# Altium footprint library IC_SMD_BGA.PCBLIB: 97 footprints (part 2 of 11)
Each footprint in its own frame and in the unit in brackets; x right, y up, seen from the top. Pads: shape width x height; smd on the part's side, far side on the other; paste and mask are expansions set on the pad; w line width, h text height; cw(c..) or ccw(c..) is an arc to the next point about the centre after c.
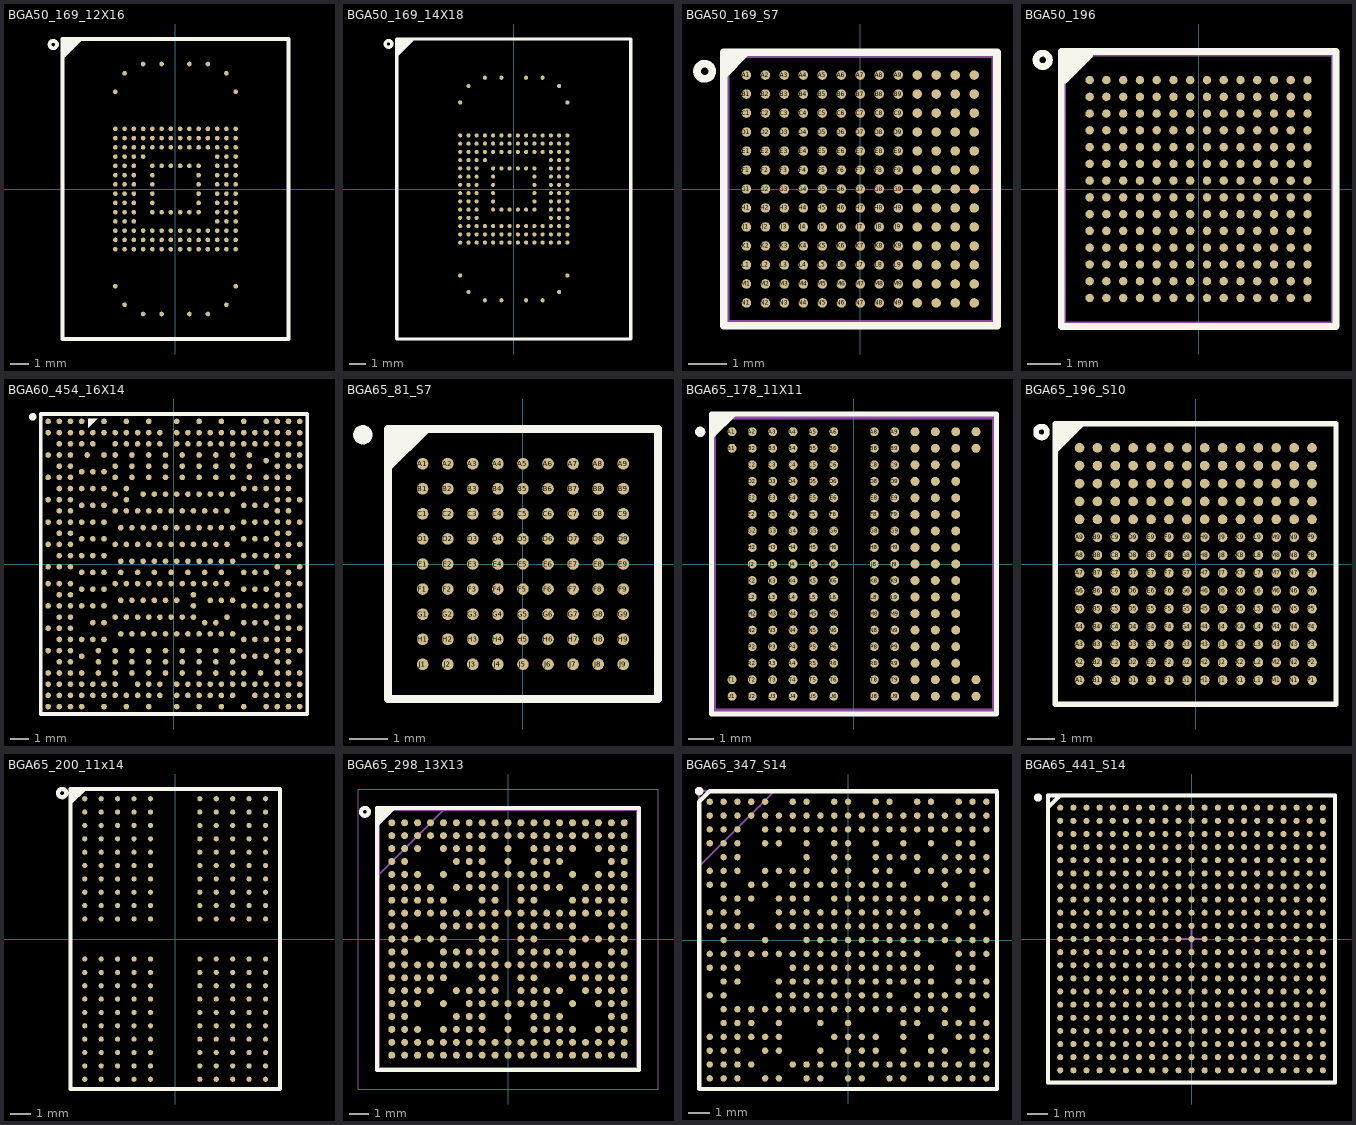
[diagram p1: the footprints below, top view; thin cyan lines are the x and y axes]

## BGA50_169_12X16 [mm] "BGA 153ball, pitch:0.5mm, 12x16mm"
pads (169):
  round 0.25 smd mask+0.05: A4(-1.75,6.75) A6(-0.75,6.75) A9(0.75,6.75) A11(1.75,6.75) AA1(-3.25,-3.25) AA2(-2.75,-3.25) AA3(-2.25,-3.25) AA4(-1.75,-3.25) AA5(-1.25,-3.25) AA6(-0.75,-3.25) AA7(-0.25,-3.25) AA8(0.25,-3.25) AA9(0.75,-3.25) AA10(1.25,-3.25) AA11(1.75,-3.25) AA12(2.25,-3.25) AA13(2.75,-3.25) AA14(3.25,-3.25) AE1(-3.25,-5.25) AE14(3.25,-5.25) AG2(-2.75,-6.25) AG13(2.75,-6.25) AH4(-1.75,-6.75) AH6(-0.75,-6.75) AH9(0.75,-6.75) AH11(1.75,-6.75) B2(-2.75,6.25) B13(2.75,6.25) D1(-3.25,5.25) D14(3.25,5.25) H1(-3.25,3.25) H2(-2.75,3.25) H3(-2.25,3.25) H4(-1.75,3.25) H5(-1.25,3.25) H6(-0.75,3.25) H7(-0.25,3.25) H8(0.25,3.25) H9(0.75,3.25) H10(1.25,3.25) H11(1.75,3.25) H12(2.25,3.25) H13(2.75,3.25) H14(3.25,3.25) J1(-3.25,2.75) J2(-2.75,2.75) J3(-2.25,2.75) J4(-1.75,2.75) J5(-1.25,2.75) J6(-0.75,2.75) J7(-0.25,2.75) J8(0.25,2.75) J9(0.75,2.75) J10(1.25,2.75) J11(1.75,2.75) J12(2.25,2.75) J13(2.75,2.75) J14(3.25,2.75) K1(-3.25,2.25) K2(-2.75,2.25) K3(-2.25,2.25) K4(-1.75,2.25) K5(-1.25,2.25) K6(-0.75,2.25) K7(-0.25,2.25) K8(0.25,2.25) K9(0.75,2.25) K10(1.25,2.25) K11(1.75,2.25) K12(2.25,2.25) K13(2.75,2.25) K14(3.25,2.25) L1(-3.25,1.75) L2(-2.75,1.75) L3(-2.25,1.75) L4(-1.75,1.75) L12(2.25,1.75) L13(2.75,1.75) L14(3.25,1.75) M1(-3.25,1.25) M2(-2.75,1.25) M3(-2.25,1.25) M5(-1.25,1.25) M6(-0.75,1.25) M7(-0.25,1.25) M8(0.25,1.25) M9(0.75,1.25) M10(1.25,1.25) M12(2.25,1.25) M13(2.75,1.25) M14(3.25,1.25) N1(-3.25,0.75) N2(-2.75,0.75) N3(-2.25,0.75) N5(-1.25,0.75) N10(1.25,0.75) N12(2.25,0.75) N13(2.75,0.75) N14(3.25,0.75) P1(-3.25,0.25) P2(-2.75,0.25) P3(-2.25,0.25) P5(-1.25,0.25) P10(1.25,0.25) P12(2.25,0.25) P13(2.75,0.25) P14(3.25,0.25) R1(-3.25,-0.25) R2(-2.75,-0.25) R3(-2.25,-0.25) R5(-1.25,-0.25) R10(1.25,-0.25) R12(2.25,-0.25) R13(2.75,-0.25) R14(3.25,-0.25) T1(-3.25,-0.75) T2(-2.75,-0.75) T3(-2.25,-0.75) T5(-1.25,-0.75) T10(1.25,-0.75) T12(2.25,-0.75) T13(2.75,-0.75) T14(3.25,-0.75) U1(-3.25,-1.25) U2(-2.75,-1.25) U3(-2.25,-1.25) U5(-1.25,-1.25) U6(-0.75,-1.25) U7(-0.25,-1.25) U8(0.25,-1.25) U9(0.75,-1.25) U10(1.25,-1.25) U12(2.25,-1.25) U13(2.75,-1.25) U14(3.25,-1.25) V1(-3.25,-1.75) V2(-2.75,-1.75) V3(-2.25,-1.75) V12(2.25,-1.75) V13(2.75,-1.75) V14(3.25,-1.75) W1(-3.25,-2.25) W2(-2.75,-2.25) W3(-2.25,-2.25) W4(-1.75,-2.25) W5(-1.25,-2.25) W6(-0.75,-2.25) W7(-0.25,-2.25) W8(0.25,-2.25) W9(0.75,-2.25) W10(1.25,-2.25) W11(1.75,-2.25) W12(2.25,-2.25) W13(2.75,-2.25) W14(3.25,-2.25) Y1(-3.25,-2.75) Y2(-2.75,-2.75) Y3(-2.25,-2.75) Y4(-1.75,-2.75) Y5(-1.25,-2.75) Y6(-0.75,-2.75) Y7(-0.25,-2.75) Y8(0.25,-2.75) Y9(0.75,-2.75) Y10(1.25,-2.75) Y11(1.75,-2.75) Y12(2.25,-2.75) Y13(2.75,-2.75) Y14(3.25,-2.75)
TopOverlay:
  circle w0.2: c-6.6,7.8 r0.2
  region: -6.1,7 -5,8.1 -6.1,8.1
  lines w0.2: -6.1,-8.1 -6.1,8.1 6.1,8.1 6.1,-8.1 -6.1,-8.1
3D body: height 0.8, standoff 0, extent -6,-8 6,8

## BGA50_169_14X18 [mm] "BGA 153ball, pitch:0.5mm, 14x18mm"
pads (169):
  round 0.25 smd mask+0.05: A4(-1.75,6.75) A6(-0.75,6.75) A9(0.75,6.75) A11(1.75,6.75) AA1(-3.25,-3.25) AA2(-2.75,-3.25) AA3(-2.25,-3.25) AA4(-1.75,-3.25) AA5(-1.25,-3.25) AA6(-0.75,-3.25) AA7(-0.25,-3.25) AA8(0.25,-3.25) AA9(0.75,-3.25) AA10(1.25,-3.25) AA11(1.75,-3.25) AA12(2.25,-3.25) AA13(2.75,-3.25) AA14(3.25,-3.25) AE1(-3.25,-5.25) AE14(3.25,-5.25) AG2(-2.75,-6.25) AG13(2.75,-6.25) AH4(-1.75,-6.75) AH6(-0.75,-6.75) AH9(0.75,-6.75) AH11(1.75,-6.75) B2(-2.75,6.25) B13(2.75,6.25) D1(-3.25,5.25) D14(3.25,5.25) H1(-3.25,3.25) H2(-2.75,3.25) H3(-2.25,3.25) H4(-1.75,3.25) H5(-1.25,3.25) H6(-0.75,3.25) H7(-0.25,3.25) H8(0.25,3.25) H9(0.75,3.25) H10(1.25,3.25) H11(1.75,3.25) H12(2.25,3.25) H13(2.75,3.25) H14(3.25,3.25) J1(-3.25,2.75) J2(-2.75,2.75) J3(-2.25,2.75) J4(-1.75,2.75) J5(-1.25,2.75) J6(-0.75,2.75) J7(-0.25,2.75) J8(0.25,2.75) J9(0.75,2.75) J10(1.25,2.75) J11(1.75,2.75) J12(2.25,2.75) J13(2.75,2.75) J14(3.25,2.75) K1(-3.25,2.25) K2(-2.75,2.25) K3(-2.25,2.25) K4(-1.75,2.25) K5(-1.25,2.25) K6(-0.75,2.25) K7(-0.25,2.25) K8(0.25,2.25) K9(0.75,2.25) K10(1.25,2.25) K11(1.75,2.25) K12(2.25,2.25) K13(2.75,2.25) K14(3.25,2.25) L1(-3.25,1.75) L2(-2.75,1.75) L3(-2.25,1.75) L4(-1.75,1.75) L12(2.25,1.75) L13(2.75,1.75) L14(3.25,1.75) M1(-3.25,1.25) M2(-2.75,1.25) M3(-2.25,1.25) M5(-1.25,1.25) M6(-0.75,1.25) M7(-0.25,1.25) M8(0.25,1.25) M9(0.75,1.25) M10(1.25,1.25) M12(2.25,1.25) M13(2.75,1.25) M14(3.25,1.25) N1(-3.25,0.75) N2(-2.75,0.75) N3(-2.25,0.75) N5(-1.25,0.75) N10(1.25,0.75) N12(2.25,0.75) N13(2.75,0.75) N14(3.25,0.75) P1(-3.25,0.25) P2(-2.75,0.25) P3(-2.25,0.25) P5(-1.25,0.25) P10(1.25,0.25) P12(2.25,0.25) P13(2.75,0.25) P14(3.25,0.25) R1(-3.25,-0.25) R2(-2.75,-0.25) R3(-2.25,-0.25) R5(-1.25,-0.25) R10(1.25,-0.25) R12(2.25,-0.25) R13(2.75,-0.25) R14(3.25,-0.25) T1(-3.25,-0.75) T2(-2.75,-0.75) T3(-2.25,-0.75) T5(-1.25,-0.75) T10(1.25,-0.75) T12(2.25,-0.75) T13(2.75,-0.75) T14(3.25,-0.75) U1(-3.25,-1.25) U2(-2.75,-1.25) U3(-2.25,-1.25) U5(-1.25,-1.25) U6(-0.75,-1.25) U7(-0.25,-1.25) U8(0.25,-1.25) U9(0.75,-1.25) U10(1.25,-1.25) U12(2.25,-1.25) U13(2.75,-1.25) U14(3.25,-1.25) V1(-3.25,-1.75) V2(-2.75,-1.75) V3(-2.25,-1.75) V12(2.25,-1.75) V13(2.75,-1.75) V14(3.25,-1.75) W1(-3.25,-2.25) W2(-2.75,-2.25) W3(-2.25,-2.25) W4(-1.75,-2.25) W5(-1.25,-2.25) W6(-0.75,-2.25) W7(-0.25,-2.25) W8(0.25,-2.25) W9(0.75,-2.25) W10(1.25,-2.25) W11(1.75,-2.25) W12(2.25,-2.25) W13(2.75,-2.25) W14(3.25,-2.25) Y1(-3.25,-2.75) Y2(-2.75,-2.75) Y3(-2.25,-2.75) Y4(-1.75,-2.75) Y5(-1.25,-2.75) Y6(-0.75,-2.75) Y7(-0.25,-2.75) Y8(0.25,-2.75) Y9(0.75,-2.75) Y10(1.25,-2.75) Y11(1.75,-2.75) Y12(2.25,-2.75) Y13(2.75,-2.75) Y14(3.25,-2.75)
TopOverlay:
  circle w0.2: c-7.6,8.8 r0.2
  region: -7.1,8 -6,9.1 -7.1,9.1
  lines w0.2: -7.1,-9.1 7.1,-9.1 7.1,9.1 -7.1,9.1 -7.1,-9.1
3D body: height 0.8, standoff 0, extent -7,-9 7,9

## BGA50_169_S7 [mm] "BGA; 169 Balls; Body 7 x 7 mm; Pitch 0.5mm"
height 1
pads (169):
  round 0.25 smd mask+0.075: A1(-3,3) A2(-2.5,3) A3(-2,3) A4(-1.5,3) A5(-1,3) A6(-0.5,3) A7(0,3) A8(0.5,3) A9(1,3) A10(1.5,3) A11(2,3) A12(2.5,3) A13(3,3) B1(-3,2.5) B2(-2.5,2.5) B3(-2,2.5) B4(-1.5,2.5) B5(-1,2.5) B6(-0.5,2.5) B7(0,2.5) B8(0.5,2.5) B9(1,2.5) B10(1.5,2.5) B11(2,2.5) B12(2.5,2.5) B13(3,2.5) C1(-3,2) C2(-2.5,2) C3(-2,2) C4(-1.5,2) C5(-1,2) C6(-0.5,2) C7(0,2) C8(0.5,2) C9(1,2) C10(1.5,2) C11(2,2) C12(2.5,2) C13(3,2) D1(-3,1.5) D2(-2.5,1.5) D3(-2,1.5) D4(-1.5,1.5) D5(-1,1.5) D6(-0.5,1.5) D7(0,1.5) D8(0.5,1.5) D9(1,1.5) D10(1.5,1.5) D11(2,1.5) D12(2.5,1.5) D13(3,1.5) E1(-3,1) E2(-2.5,1) E3(-2,1) E4(-1.5,1) E5(-1,1) E6(-0.5,1) E7(0,1) E8(0.5,1) E9(1,1) E10(1.5,1) E11(2,1) E12(2.5,1) E13(3,1) F1(-3,0.5) F2(-2.5,0.5) F3(-2,0.5) F4(-1.5,0.5) F5(-1,0.5) F6(-0.5,0.5) F7(0,0.5) F8(0.5,0.5) F9(1,0.5) F10(1.5,0.5) F11(2,0.5) F12(2.5,0.5) F13(3,0.5) G1(-3,0) G2(-2.5,0) G3(-2,0) G4(-1.5,0) G5(-1,0) G6(-0.5,0) G7(0,0) G8(0.5,0) G9(1,0) G10(1.5,0) G11(2,0) G12(2.5,0) G13(3,0) H1(-3,-0.5) H2(-2.5,-0.5) H3(-2,-0.5) H4(-1.5,-0.5) H5(-1,-0.5) H6(-0.5,-0.5) H7(0,-0.5) H8(0.5,-0.5) H9(1,-0.5) H10(1.5,-0.5) H11(2,-0.5) H12(2.5,-0.5) H13(3,-0.5) J1(-3,-1) J2(-2.5,-1) J3(-2,-1) J4(-1.5,-1) J5(-1,-1) J6(-0.5,-1) J7(0,-1) J8(0.5,-1) J9(1,-1) J10(1.5,-1) J11(2,-1) J12(2.5,-1) J13(3,-1) K1(-3,-1.5) K2(-2.5,-1.5) K3(-2,-1.5) K4(-1.5,-1.5) K5(-1,-1.5) K6(-0.5,-1.5) K7(0,-1.5) K8(0.5,-1.5) K9(1,-1.5) K10(1.5,-1.5) K11(2,-1.5) K12(2.5,-1.5) K13(3,-1.5) L1(-3,-2) L2(-2.5,-2) L3(-2,-2) L4(-1.5,-2) L5(-1,-2) L6(-0.5,-2) L7(0,-2) L8(0.5,-2) L9(1,-2) L10(1.5,-2) L11(2,-2) L12(2.5,-2) L13(3,-2) M1(-3,-2.5) M2(-2.5,-2.5) M3(-2,-2.5) M4(-1.5,-2.5) M5(-1,-2.5) M6(-0.5,-2.5) M7(0,-2.5) M8(0.5,-2.5) M9(1,-2.5) M10(1.5,-2.5) M11(2,-2.5) M12(2.5,-2.5) M13(3,-2.5) N1(-3,-3) N2(-2.5,-3) N3(-2,-3) N4(-1.5,-3) N5(-1,-3) N6(-0.5,-3) N7(0,-3) N8(0.5,-3) N9(1,-3) N10(1.5,-3) N11(2,-3) N12(2.5,-3) N13(3,-3)
TopOverlay:
  circle w0.2: c-4.1,3.1 r0.2
  region: -3,3.6 -3.6,3 -3.6,3.6
  lines w0.2: -3.6,3 -3,3.6 ; -3.6,-3.6 3.6,-3.6 3.6,3.6 -3.6,3.6 -3.6,-3.6
Mechanical13:
  lines w0.1: -3.5,-3.5 3.5,-3.5 3.5,3.5 -3.5,3.5 -3.5,-3.5
3D body: height 1, standoff 0.15, extent -3.5,-3.5 3.5,3.5

## BGA50_196 [mm] "BGA, CPGA196, 8x8mm, Pitch 0.50mm"
height 1
pads (196):
  round 0.25 smd mask+0.05: A1(-3.25,3.25) A2(-2.75,3.25) A3(-2.25,3.25) A4(-1.75,3.25) A5(-1.25,3.25) A6(-0.75,3.25) A7(-0.25,3.25) A8(0.25,3.25) A9(0.75,3.25) A10(1.25,3.25) A11(1.75,3.25) A12(2.25,3.25) A13(2.75,3.25) A14(3.25,3.25) B1(-3.25,2.75) B2(-2.75,2.75) B3(-2.25,2.75) B4(-1.75,2.75) B5(-1.25,2.75) B6(-0.75,2.75) B7(-0.25,2.75) B8(0.25,2.75) B9(0.75,2.75) B10(1.25,2.75) B11(1.75,2.75) B12(2.25,2.75) B13(2.75,2.75) B14(3.25,2.75) C1(-3.25,2.25) C2(-2.75,2.25) C3(-2.25,2.25) C4(-1.75,2.25) C5(-1.25,2.25) C6(-0.75,2.25) C7(-0.25,2.25) C8(0.25,2.25) C9(0.75,2.25) C10(1.25,2.25) C11(1.75,2.25) C12(2.25,2.25) C13(2.75,2.25) C14(3.25,2.25) D1(-3.25,1.75) D2(-2.75,1.75) D3(-2.25,1.75) D4(-1.75,1.75) D5(-1.25,1.75) D6(-0.75,1.75) D7(-0.25,1.75) D8(0.25,1.75) D9(0.75,1.75) D10(1.25,1.75) D11(1.75,1.75) D12(2.25,1.75) D13(2.75,1.75) D14(3.25,1.75) E1(-3.25,1.25) E2(-2.75,1.25) E3(-2.25,1.25) E4(-1.75,1.25) E5(-1.25,1.25) E6(-0.75,1.25) E7(-0.25,1.25) E8(0.25,1.25) E9(0.75,1.25) E10(1.25,1.25) E11(1.75,1.25) E12(2.25,1.25) E13(2.75,1.25) E14(3.25,1.25) F1(-3.25,0.75) F2(-2.75,0.75) F3(-2.25,0.75) F4(-1.75,0.75) F5(-1.25,0.75) F6(-0.75,0.75) F7(-0.25,0.75) F8(0.25,0.75) F9(0.75,0.75) F10(1.25,0.75) F11(1.75,0.75) F12(2.25,0.75) F13(2.75,0.75) F14(3.25,0.75) G1(-3.25,0.25) G2(-2.75,0.25) G3(-2.25,0.25) G4(-1.75,0.25) G5(-1.25,0.25) G6(-0.75,0.25) G7(-0.25,0.25) G8(0.25,0.25) G9(0.75,0.25) G10(1.25,0.25) G11(1.75,0.25) G12(2.25,0.25) G13(2.75,0.25) G14(3.25,0.25) H1(-3.25,-0.25) H2(-2.75,-0.25) H3(-2.25,-0.25) H4(-1.75,-0.25) H5(-1.25,-0.25) H6(-0.75,-0.25) H7(-0.25,-0.25) H8(0.25,-0.25) H9(0.75,-0.25) H10(1.25,-0.25) H11(1.75,-0.25) H12(2.25,-0.25) H13(2.75,-0.25) H14(3.25,-0.25) J1(-3.25,-0.75) J2(-2.75,-0.75) J3(-2.25,-0.75) J4(-1.75,-0.75) J5(-1.25,-0.75) J6(-0.75,-0.75) J7(-0.25,-0.75) J8(0.25,-0.75) J9(0.75,-0.75) J10(1.25,-0.75) J11(1.75,-0.75) J12(2.25,-0.75) J13(2.75,-0.75) J14(3.25,-0.75) K1(-3.25,-1.25) K2(-2.75,-1.25) K3(-2.25,-1.25) K4(-1.75,-1.25) K5(-1.25,-1.25) K6(-0.75,-1.25) K7(-0.25,-1.25) K8(0.25,-1.25) K9(0.75,-1.25) K10(1.25,-1.25) K11(1.75,-1.25) K12(2.25,-1.25) K13(2.75,-1.25) K14(3.25,-1.25) L1(-3.25,-1.75) L2(-2.75,-1.75) L3(-2.25,-1.75) L4(-1.75,-1.75) L5(-1.25,-1.75) L6(-0.75,-1.75) L7(-0.25,-1.75) L8(0.25,-1.75) L9(0.75,-1.75) L10(1.25,-1.75) L11(1.75,-1.75) L12(2.25,-1.75) L13(2.75,-1.75) L14(3.25,-1.75) M1(-3.25,-2.25) M2(-2.75,-2.25) M3(-2.25,-2.25) M4(-1.75,-2.25) M5(-1.25,-2.25) M6(-0.75,-2.25) M7(-0.25,-2.25) M8(0.25,-2.25) M9(0.75,-2.25) M10(1.25,-2.25) M11(1.75,-2.25) M12(2.25,-2.25) M13(2.75,-2.25) M14(3.25,-2.25) N1(-3.25,-2.75) N2(-2.75,-2.75) N3(-2.25,-2.75) N4(-1.75,-2.75) N5(-1.25,-2.75) N6(-0.75,-2.75) N7(-0.25,-2.75) N8(0.25,-2.75) N9(0.75,-2.75) N10(1.25,-2.75) N11(1.75,-2.75) N12(2.25,-2.75) N13(2.75,-2.75) N14(3.25,-2.75) P1(-3.25,-3.25) P2(-2.75,-3.25) P3(-2.25,-3.25) P4(-1.75,-3.25) P5(-1.25,-3.25) P6(-0.75,-3.25) P7(-0.25,-3.25) P8(0.25,-3.25) P9(0.75,-3.25) P10(1.25,-3.25) P11(1.75,-3.25) P12(2.25,-3.25) P13(2.75,-3.25) P14(3.25,-3.25)
TopOverlay:
  circle w0.2: c-4.65,3.85 r0.2
  region: -3.242,4 -4,3.242 -4,4
  lines w0.2: -4,3.242 -3.242,4 ; -4.1,-4.1 -4.1,4.1 4.1,4.1 4.1,-4.1 -4.1,-4.1
Mechanical13:
  lines w0.1: -4,-4 -4,4 4,4 4,-4 -4,-4
3D body "BGA50_196.step": height 1, standoff 0, extent -4,-4 4,4

## BGA60_454_16X14 [mm] "FCBGA, 52x46 ball matrix, 14.3x16.1mm, 0.6mm pitch staggered"
height 1.1
pads (454):
  round 0.3 smd mask+0.05: A1(-6.75,7.65) A3(-6.15,7.65) A5(-5.55,7.65) A7(-4.95,7.65) A11(-3.75,7.65) A15(-2.55,7.65) A19(-1.35,7.65) A24(0.15,7.65) A28(1.35,7.65) A32(2.55,7.65) A36(3.75,7.65) A40(4.95,7.65) A42(5.55,7.65) A44(6.15,7.65) A46(6.75,7.65) AA3(-6.15,1.65) AA5(-5.55,1.65) AA42(5.55,1.65) AA44(6.15,1.65) AB7(-4.95,1.35) AB9(-4.35,1.35) AB11(-3.75,1.35) AB36(3.75,1.35) AB38(4.35,1.35) AB40(4.95,1.35) AC1(-6.75,1.05) AC3(-6.15,1.05) AC5(-5.55,1.05) AC13(-3.15,1.05) AC15(-2.55,1.05) AC17(-1.95,1.05) AC19(-1.35,1.05) AC21(-0.75,1.05) AC23(-0.15,1.05) AC25(0.45,1.05) AC27(1.05,1.05) AC29(1.65,1.05) AC31(2.25,1.05) AC33(2.85,1.05) AC42(5.55,1.05) AC44(6.15,1.05) AC46(6.75,1.05) AE3(-6.15,0.45) AE5(-5.55,0.45) AE7(-4.95,0.45) AE9(-4.35,0.45) AE11(-3.75,0.45) AE36(3.75,0.45) AE38(4.35,0.45) AE40(4.95,0.45) AE42(5.55,0.45) AE44(6.15,0.45) AF14(-2.85,0.15) AF16(-2.25,0.15) AF18(-1.65,0.15) AF20(-1.05,0.15) AF22(-0.45,0.15) AF24(0.15,0.15) AF26(0.75,0.15) AF28(1.35,0.15) AF30(1.95,0.15) AF32(2.55,0.15) AF34(3.15,0.15) AG1(-6.75,-0.15) AG3(-6.15,-0.15) AG5(-5.55,-0.15) AG42(5.55,-0.15) AG46(6.75,-0.15) AH7(-4.95,-0.45) AH9(-4.35,-0.45) AH11(-3.75,-0.45) AH14(-2.85,-0.45) AH17(-1.95,-0.45) AH20(-1.05,-0.45) AH23(-0.15,-0.45) AH26(0.75,-0.45) AH29(1.65,-0.45) AH32(2.55,-0.45) AH36(3.75,-0.45) AH38(4.35,-0.45) AH40(4.95,-0.45) AH44(6.15,-0.45) AK1(-6.75,-1.05) AK3(-6.15,-1.05) AK5(-5.55,-1.05) AK13(-3.15,-1.05) AK15(-2.55,-1.05) AK17(-1.95,-1.05) AK19(-1.35,-1.05) AK21(-0.75,-1.05) AK23(-0.15,-1.05) AK25(0.45,-1.05) AK27(1.05,-1.05) AK29(1.65,-1.05) AK31(2.25,-1.05) AK33(2.85,-1.05) AK42(5.55,-1.05) AK44(6.15,-1.05) AK46(6.75,-1.05) AL7(-4.95,-1.35) AL9(-4.35,-1.35) AL11(-3.75,-1.35) AL36(3.75,-1.35) AL38(4.35,-1.35) AL40(4.95,-1.35) AM3(-6.15,-1.65) AM5(-5.55,-1.65) AM27(1.05,-1.65) AM42(5.55,-1.65) AM44(6.15,-1.65) AN14(-2.85,-1.95) AN16(-2.25,-1.95) AN18(-1.65,-1.95) AN20(-1.05,-1.95) AN22(-0.45,-1.95) AN24(0.15,-1.95) AN30(1.95,-1.95) AN32(2.55,-1.95) AN34(3.15,-1.95) AP1(-6.75,-2.25) AP3(-6.15,-2.25) AP5(-5.55,-2.25) AP7(-4.95,-2.25) AP9(-4.35,-2.25) AP11(-3.75,-2.25) AP27(1.05,-2.25) AP36(3.75,-2.25) AP38(4.35,-2.25) AP40(4.95,-2.25) AP42(5.55,-2.25) AP44(6.15,-2.25) AP46(6.75,-2.25) AT3(-6.15,-2.85) AT5(-5.55,-2.85) AT13(-3.15,-2.85) AT15(-2.55,-2.85) AT17(-1.95,-2.85) AT19(-1.35,-2.85) AT21(-0.75,-2.85) AT23(-0.15,-2.85) AT25(0.45,-2.85) AT27(1.05,-2.85) AT33(2.85,-2.85) AT42(5.55,-2.85) AT44(6.15,-2.85) AU9(-4.35,-3.15) AU11(-3.75,-3.15) AU29(1.65,-3.15) AU31(2.25,-3.15) AU36(3.75,-3.15) AU38(4.35,-3.15) AU40(4.95,-3.15) AV1(-6.75,-3.45) AV3(-6.15,-3.45) AV5(-5.55,-3.45) AV42(5.55,-3.45) AV44(6.15,-3.45) AV46(6.75,-3.45) AW14(-2.85,-3.75) AW16(-2.25,-3.75) AW18(-1.65,-3.75) AW20(-1.05,-3.75) AW22(-0.45,-3.75) AW24(0.15,-3.75) AW26(0.75,-3.75) AW28(1.35,-3.75) AW30(1.95,-3.75) AW32(2.55,-3.75) AW34(3.15,-3.75) AY3(-6.15,-4.05) AY5(-5.55,-4.05) AY7(-4.95,-4.05) AY9(-4.35,-4.05) AY11(-3.75,-4.05) AY36(3.75,-4.05) AY38(4.35,-4.05) AY40(4.95,-4.05) AY42(5.55,-4.05) AY44(6.15,-4.05) BB1(-6.75,-4.65) BB3(-6.15,-4.65) BB5(-5.55,-4.65) BB10(-4.05,-4.65) BB13(-3.15,-4.65) BB16(-2.25,-4.65) BB19(-1.35,-4.65) BB22(-0.45,-4.65) BB25(0.45,-4.65) BB28(1.35,-4.65) BB31(2.25,-4.65) BB34(3.15,-4.65) BB42(5.55,-4.65) BB44(6.15,-4.65) BB46(6.75,-4.65) BC7(-4.95,-4.95) BC36(3.75,-4.95) BC38(4.35,-4.95) BC40(4.95,-4.95) BD3(-6.15,-5.25) BD5(-5.55,-5.25) BD10(-4.05,-5.25) BD13(-3.15,-5.25) BD16(-2.25,-5.25) BD19(-1.35,-5.25) BD22(-0.45,-5.25) BD25(0.45,-5.25) BD28(1.35,-5.25) BD31(2.25,-5.25) BD34(3.15,-5.25) BD42(5.55,-5.25) BD44(6.15,-5.25) BF1(-6.75,-5.85) BF3(-6.15,-5.85) BF5(-5.55,-5.85) BF7(-4.95,-5.85) BF10(-4.05,-5.85) BF13(-3.15,-5.85) BF16(-2.25,-5.85) BF19(-1.35,-5.85) BF22(-0.45,-5.85) BF25(0.45,-5.85) BF28(1.35,-5.85) BF31(2.25,-5.85) BF34(3.15,-5.85) BF36(3.75,-5.85) BF39(4.65,-5.85) BF42(5.55,-5.85) BF44(6.15,-5.85) BF46(6.75,-5.85) BH1(-6.75,-6.45) BH3(-6.15,-6.45) BH5(-5.55,-6.45) BH7(-4.95,-6.45) BH9(-4.35,-6.45) BH11(-3.75,-6.45) BH13(-3.15,-6.45) BH17(-1.95,-6.45) BH19(-1.35,-6.45) BH21(-0.75,-6.45) BH24(0.15,-6.45) BH26(0.75,-6.45) BH28(1.35,-6.45) BH30(1.95,-6.45) BH32(2.55,-6.45) BH34(3.15,-6.45) BH36(3.75,-6.45) BH38(4.35,-6.45) BH40(4.95,-6.45) BH42(5.55,-6.45) BH44(6.15,-6.45) BH46(6.75,-6.45) BK1(-6.75,-7.05) BK3(-6.15,-7.05) BK5(-5.55,-7.05) BK7(-4.95,-7.05) BK9(-4.35,-7.05) BK11(-3.75,-7.05) BK13(-3.15,-7.05) BK15(-2.55,-7.05) BK17(-1.95,-7.05) BK19(-1.35,-7.05) BK21(-0.75,-7.05) BK24(0.15,-7.05) BK26(0.75,-7.05) BK28(1.35,-7.05) BK30(1.95,-7.05) BK32(2.55,-7.05) BK34(3.15,-7.05) BK38(4.35,-7.05) BK40(4.95,-7.05) BK42(5.55,-7.05) BK44(6.15,-7.05) BK46(6.75,-7.05) BM1(-6.75,-7.65) BM3(-6.15,-7.65) BM5(-5.55,-7.65) BM7(-4.95,-7.65) BM11(-3.75,-7.65) BM15(-2.55,-7.65) BM19(-1.35,-7.65) BM24(0.15,-7.65) BM28(1.35,-7.65) BM32(2.55,-7.65) BM36(3.75,-7.65) BM40(4.95,-7.65) BM42(5.55,-7.65) BM44(6.15,-7.65) BM46(6.75,-7.65) C1(-6.75,7.05) C3(-6.15,7.05) C5(-5.55,7.05) C7(-4.95,7.05) C9(-4.35,7.05) C11(-3.75,7.05) C13(-3.15,7.05) C15(-2.55,7.05) C17(-1.95,7.05) C19(-1.35,7.05) C21(-0.75,7.05) C24(0.15,7.05) C26(0.75,7.05) C28(1.35,7.05) C30(1.95,7.05) C32(2.55,7.05) C34(3.15,7.05) C36(3.75,7.05) C38(4.35,7.05) C40(4.95,7.05) C42(5.55,7.05) C44(6.15,7.05) C46(6.75,7.05) E3(-6.15,6.45) E5(-5.55,6.45) E7(-4.95,6.45) E9(-4.35,6.45) E13(-3.15,6.45) E15(-2.55,6.45) E17(-1.95,6.45) E19(-1.35,6.45) E21(-0.75,6.45) E24(0.15,6.45) E26(0.75,6.45) E28(1.35,6.45) E30(1.95,6.45) E32(2.55,6.45) E34(3.15,6.45) E36(3.75,6.45) E38(4.35,6.45) E40(4.95,6.45) E42(5.55,6.45) E44(6.15,6.45) E46(6.75,6.45) G1(-6.75,5.85) G3(-6.15,5.85) G5(-5.55,5.85) G8(-4.65,5.85) G11(-3.75,5.85) G13(-3.15,5.85) G16(-2.25,5.85) G19(-1.35,5.85) G22(-0.45,5.85) G25(0.45,5.85) G28(1.35,5.85) G31(2.25,5.85) G34(3.15,5.85) G37(4.05,5.85) G42(5.55,5.85) G44(6.15,5.85) G46(6.75,5.85) H40(4.95,5.55) J3(-6.15,5.25) J5(-5.55,5.25) J13(-3.15,5.25) J16(-2.25,5.25) J19(-1.35,5.25) J22(-0.45,5.25) J25(0.45,5.25) J28(1.35,5.25) J31(2.25,5.25) J34(3.15,5.25) J37(4.05,5.25) J42(5.55,5.25) J44(6.15,5.25) J46(6.75,5.25) K7(-4.95,4.95) K9(-4.35,4.95) K11(-3.75,4.95) L1(-6.75,4.65) L3(-6.15,4.65) L5(-5.55,4.65) L13(-3.15,4.65) L16(-2.25,4.65) L19(-1.35,4.65) L22(-0.45,4.65) L25(0.45,4.65) L28(1.35,4.65) L31(2.25,4.65) L34(3.15,4.65) L37(4.05,4.65) L40(4.95,4.65) L42(5.55,4.65) L44(6.15,4.65) N3(-6.15,4.05) N5(-5.55,4.05) N7(-4.95,4.05) N9(-4.35,4.05) N11(-3.75,4.05) N15(-2.55,4.05) N36(3.75,4.05) N38(4.35,4.05) N40(4.95,4.05) N42(5.55,4.05) N44(6.15,4.05) P13(-3.15,3.75) P18(-1.65,3.75) P20(-1.05,3.75) P22(-0.45,3.75) P24(0.15,3.75) P26(0.75,3.75) P28(1.35,3.75) P30(1.95,3.75) P32(2.55,3.75) P34(3.15,3.75) R1(-6.75,3.45) R3(-6.15,3.45) R5(-5.55,3.45) R15(-2.55,3.45) R42(5.55,3.45) R44(6.15,3.45) R46(6.75,3.45) T7(-4.95,3.15) T9(-4.35,3.15) T11(-3.75,3.15) T36(3.75,3.15) T38(4.35,3.15) T40(4.95,3.15) U3(-6.15,2.85) U5(-5.55,2.85) U13(-3.15,2.85) U15(-2.55,2.85) U17(-1.95,2.85) U19(-1.35,2.85) U21(-0.75,2.85) U23(-0.15,2.85) U25(0.45,2.85) U27(1.05,2.85) U29(1.65,2.85) U31(2.25,2.85) U33(2.85,2.85) U42(5.55,2.85) U44(6.15,2.85) W1(-6.75,2.25) W3(-6.15,2.25) W5(-5.55,2.25) W7(-4.95,2.25) W9(-4.35,2.25) W11(-3.75,2.25) W36(3.75,2.25) W38(4.35,2.25) W40(4.95,2.25) W42(5.55,2.25) W44(6.15,2.25) W46(6.75,2.25) Y14(-2.85,1.95) Y16(-2.25,1.95) Y18(-1.65,1.95) Y20(-1.05,1.95) Y22(-0.45,1.95) Y24(0.15,1.95) Y26(0.75,1.95) Y28(1.35,1.95) Y30(1.95,1.95) Y32(2.55,1.95) Y34(3.15,1.95)
TopOverlay:
  circle w0.2: c-7.575,7.9 r0.1
  region: -4.6,7.8 -4.6,7.3 -4.1,7.8
  lines w0.2: -7.15,-8.05 7.15,-8.05 7.15,8.05 -7.15,8.05 -7.15,-8.05
3D body: height 1.1, standoff 0.2, extent -7.15,-8.05 7.15,8.05

## BGA65_81_S7 [mm] "BGA, 81-Leads, Body 7.00x7.00mmx1.10mm, Pitch 0.65mm"
height 1.1
pads (81):
  round 0.3 smd: A1(-2.6,2.6) A2(-1.95,2.6) A3(-1.3,2.6) A4(-0.65,2.6) A5(0,2.6) A6(0.65,2.6) A7(1.3,2.6) A8(1.95,2.6) A9(2.6,2.6) B1(-2.6,1.95) B2(-1.95,1.95) B3(-1.3,1.95) B4(-0.65,1.95) B5(0,1.95) B6(0.65,1.95) B7(1.3,1.95) B8(1.95,1.95) B9(2.6,1.95) C1(-2.6,1.3) C2(-1.95,1.3) C3(-1.3,1.3) C4(-0.65,1.3) C5(0,1.3) C6(0.65,1.3) C7(1.3,1.3) C8(1.95,1.3) C9(2.6,1.3) D1(-2.6,0.65) D2(-1.95,0.65) D3(-1.3,0.65) D4(-0.65,0.65) D5(0,0.65) D6(0.65,0.65) D7(1.3,0.65) D8(1.95,0.65) D9(2.6,0.65) E1(-2.6,0) E2(-1.95,0) E3(-1.3,0) E4(-0.65,0) E5(0,0) E6(0.65,0) E7(1.3,0) E8(1.95,0) E9(2.6,0) F1(-2.6,-0.65) F2(-1.95,-0.65) F3(-1.3,-0.65) F4(-0.65,-0.65) F5(0,-0.65) F6(0.65,-0.65) F7(1.3,-0.65) F8(1.95,-0.65) F9(2.6,-0.65) G1(-2.6,-1.3) G2(-1.95,-1.3) G3(-1.3,-1.3) G4(-0.65,-1.3) G5(0,-1.3) G6(0.65,-1.3) G7(1.3,-1.3) G8(1.95,-1.3) G9(2.6,-1.3) H1(-2.6,-1.95) H2(-1.95,-1.95) H3(-1.3,-1.95) H4(-0.65,-1.95) H5(0,-1.95) H6(0.65,-1.95) H7(1.3,-1.95) H8(1.95,-1.95) H9(2.6,-1.95) J1(-2.6,-2.6) J2(-1.95,-2.6) J3(-1.3,-2.6) J4(-0.65,-2.6) J5(0,-2.6) J6(0.65,-2.6) J7(1.3,-2.6) J8(1.95,-2.6) J9(2.6,-2.6)
TopOverlay:
  circle w0.25: c-4.15,3.35 r0.125
  region: -2.5,3.5 -3.5,2.5 -3.5,3.5
  lines w0.2: -3.5,2.5 -2.5,3.5 ; -3.5,-3.5 3.5,-3.5 3.5,3.5 -3.5,3.5 -3.5,-3.5
Mechanical13:
  lines w0.1: -3.5,-3.5 3.5,-3.5 3.5,3.5 -3.5,3.5 -3.5,-3.5
3D body "BGA65_81_S7.step": height 1.1, standoff 0, extent -3.5,-3.5 3.5,3.5
